# Altium footprint library Module.PcbLib: 36 footprints (part 2 of 3)
Each footprint in its own frame and in the unit in brackets; x right, y up, seen from the top. Pads: shape width x height; smd on the part's side, far side on the other; paste and mask are expansions set on the pad; w line width, h text height; cw(c..) or ccw(c..) is an arc to the next point about the centre after c.
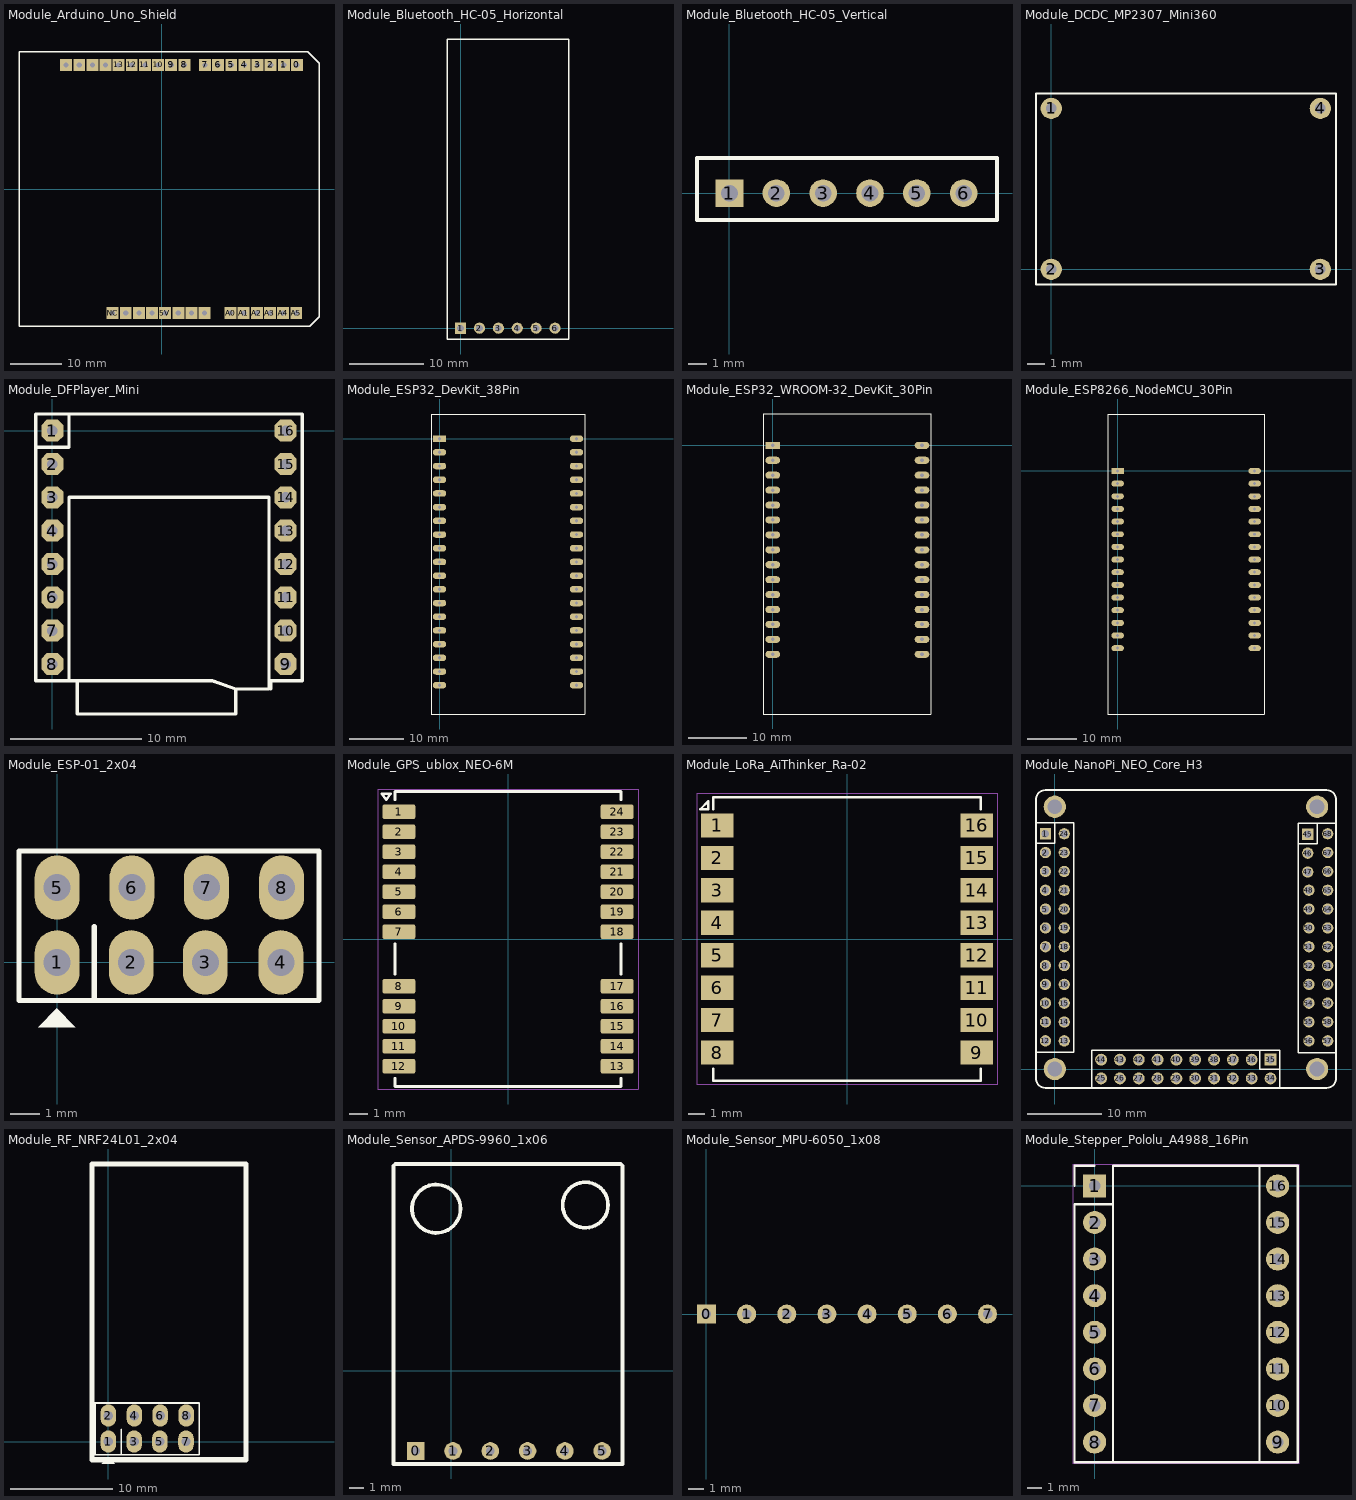
[diagram p1: the footprints below, top view; thin cyan lines are the x and y axes]

## Module_Arduino_Uno_Shield [mm] "Arduino Uno shield header footprint, 32 pins"
pads (32):
  rect 2.3x2.3 hole 1: 0(26.1,24) 1(23.56,24) 2(21.02,24) 3(18.48,24) 3V3(-1.92,-24) 4(15.94,24) 5(13.4,24) 5V(0.62,-24) 6(10.86,24) 7(8.32,24) 8(4.32,24) 9(1.78,24) 10(-0.76,24) 11(-3.3,24) 12(-5.84,24) 13(-8.38,24) A0(13.26,-24) A1(15.8,-24) A2(18.34,-24) A3(20.88,-24) A4(23.42,-24) A5(25.96,-24) AREF(-13.46,24) GND1(3.16,-24) GND2(5.7,-24) GND3(-10.92,24) IOREF(-7,-24) NC(-9.54,-24) RESET(-4.46,-24) SCL(-18.54,24) SDA(-16,24) Vin(8.24,-24)
Top Overlay:
  lines w0.254: -27.64,-26.5 28.56,-26.5 30.36,-24.7 30.36,-6.9 30.36,24.3 28.16,26.5 -27.64,26.5 -27.64,-26.5
3D body "Module_Arduino_Uno_Shield.step": height 3.6, standoff -2.5, extent -27.64,-26.65 30.36,26.65

## Module_Bluetooth_HC-05_Horizontal [mm] "HC-05 Bluetooth module 6-pin header, horizontal"
height 1.14
pads (6):
  rect 1.5x1.5 hole 0.9: 1(0,0)
  round 1.5 hole 0.9: 2(2.54,0) 3(5.08,0) 4(7.62,0) 5(10.16,0) 6(12.7,0)
Top Overlay:
  lines w0.2: -1.763,-1.455 14.511,-1.455 14.511,38.862 -1.763,38.862 -1.763,-1.455
3D body "User Library-blue.STEP": height 4.05, standoff -0.75, extent -1.522,-0.635 14.478,38.784

## Module_Bluetooth_HC-05_Vertical [mm] "HC-05 Bluetooth module 6-pin header, vertical"
height 1.14
pads (6):
  rect 1.5x1.5 hole 0.9: 1(0,0)
  round 1.5 hole 0.9: 2(2.54,0) 3(5.08,0) 4(7.62,0) 5(10.16,0) 6(12.7,0)
Top Overlay:
  lines w0.2: -1.763,-1.455 14.511,-1.455 14.511,1.905 -1.763,1.905 -1.763,-1.455
3D body "female_header_a-bl254-eg-g06d.stp": height 7.92, standoff -3.78, extent -1.395,-1.237 14.095,1.263
3D body "User Library-blue.STEP": height 38, standoff -1.42, extent -1.649,-3.556 14.351,1.239

## Module_DCDC_MP2307_Mini360 [mm] "MP2307 / Mini-360 buck converter module, 4 pins"
pads (4):
  round 1.2 hole 0.6: 1(0,9.114) 2(0,0) 3(15.24,0) 4(15.24,9.114)
Top Overlay:
  lines w0.127: -0.864,-0.864 -0.864,9.957 16.129,9.957 16.129,-0.864 -0.864,-0.864
3D body "Module_DCDC_MP2307_Mini360.step": height 6.6, standoff -2.5, extent -2.087,-2.11 17.353,11.204

## Module_DFPlayer_Mini [mil] "DFPlayer Mini MP3 player module, 16 pins, pitch 2.54mm"
pads (16):
  oct 66x66 / inner oct 60x60 / far side oct 66x66 hole 31.5: 1(0,0) 2(0,-100) 3(0,-200) 4(0,-300) 5(0,-400) 6(0,-500) 7(0,-600) 8(0,-700) 9(700,-700) 10(700,-600) 11(700,-500) 12(700,-400) 13(700,-300) 14(700,-200) 15(700,-100) 16(700,0)
Top Overlay:
  lines w10: -50,-50 50,-50 50,50 ; 50,-750 50,-200 650,-200 650,-775 550,-775 ; 655,-775 655,-765 655,-750 750,-750 750,50 -50,50 -50,-750 75,-750 ; 75,-750 480,-750 550,-775 ; 75,-750 75,-850 550,-850 550,-775
Mechanical 5:
Mechanical 7:
  lines w5: 50,-750 -50,-750 -50,50 750,50 750,-750 650,-750 ; 50,-750 50,-200 650,-200 650,-750 ; 50,-750 75,-750 ; 75,-750 475,-750 550,-775 ; 75,-750 75,-850 550,-850 550,-775 ; 550,-775 650,-775 650,-750
3D body "DFPlayer Mini Assem v1.step": height 418.11, standoff -22.83, extent -59.44,-859.17 759.46,64.45

## Module_ESP32_DevKit_38Pin [mm] "ESP32 DevKit 38-pin board footprint, pitch 2.54mm"
pads (38):
  rect 2.5x1.2 hole 0.6: 1(0,0)
  oval 2.5x1.2 hole 0.6: 2(0,-2.54) 3(0,-5.08) 4(0,-7.62) 5(0,-10.16) 6(0,-12.7) 7(0,-15.24) 8(0,-17.78) 9(0,-20.32) 10(0,-22.86) 11(0,-25.4) 12(0,-27.94) 13(0,-30.48) 14(0,-33.02) 15(0,-35.56) 16(0,-38.1) 17(0,-40.64) 18(0,-43.18) 19(0,-45.72) 20(25.4,-45.72) 21(25.4,-43.18) 22(25.4,-40.64) 23(25.4,-38.1) 24(25.4,-35.56) 25(25.4,-33.02) 26(25.4,-30.48) 27(25.4,-27.94) 28(25.4,-25.4) 29(25.4,-22.86) 30(25.4,-20.32) 31(25.4,-17.78) 32(25.4,-15.24) 33(25.4,-12.7) 34(25.4,-10.16) 35(25.4,-7.62) 36(25.4,-5.08) 37(25.4,-2.54) 38(25.4,0)
Top Overlay:
  lines w0.2: -1.524,-51.054 -1.524,4.572 13.335,4.572 26.924,4.572 26.924,-51.054 -1.524,-51.054
3D body "Goouuu-ESP32 Development Board.STEP": height 9.68, standoff -3.46, extent -1.27,-50.99 26.67,4.59

## Module_ESP32_WROOM-32_DevKit_30Pin [mm] "ESP32-WROOM-32 DevKit 30-pin board footprint, pitch 2.54mm"
pads (30):
  rect 2.5x1.2 hole 0.6: 1(0,0)
  oval 2.5x1.2 hole 0.6: 2(0,-2.54) 3(0,-5.08) 4(0,-7.62) 5(0,-10.16) 6(0,-12.7) 7(0,-15.24) 8(0,-17.78) 9(0,-20.32) 10(0,-22.86) 11(0,-25.4) 12(0,-27.94) 13(0,-30.48) 14(0,-33.02) 15(0,-35.56) 16(25.4,-35.56) 17(25.4,-33.02) 18(25.4,-30.48) 19(25.4,-27.94) 20(25.4,-25.4) 21(25.4,-22.86) 22(25.4,-20.32) 23(25.4,-17.78) 24(25.4,-15.24) 25(25.4,-12.7) 26(25.4,-10.16) 27(25.4,-7.62) 28(25.4,-5.08) 29(25.4,-2.54) 30(25.4,0)
Top Overlay:
  lines w0.2: -1.651,-45.72 -1.651,5.334 13.335,5.334 26.924,5.334 26.924,-45.72 -1.651,-45.72
3D body "ESP-WROOM32.STEP": height 10.49, standoff -1.91, extent -1.651,-45.596 26.849,5.334

## Module_ESP8266_NodeMCU_30Pin [mm] "NodeMCU ESP8266 30-pin development board footprint"
pads (30):
  rect 2.5x1.2 hole 0.6: 1(0,0)
  oval 2.5x1.2 hole 0.6: 2(0,-2.54) 3(0,-5.08) 4(0,-7.62) 5(0,-10.16) 6(0,-12.7) 7(0,-15.24) 8(0,-17.78) 9(0,-20.32) 10(0,-22.86) 11(0,-25.4) 12(0,-27.94) 13(0,-30.48) 14(0,-33.02) 15(0,-35.56) 16(27.5,-35.56) 17(27.5,-33.02) 18(27.5,-30.48) 19(27.5,-27.94) 20(27.5,-25.4) 21(27.5,-22.86) 22(27.5,-20.32) 23(27.5,-17.78) 24(27.5,-15.24) 25(27.5,-12.7) 26(27.5,-10.16) 27(27.5,-7.62) 28(27.5,-5.08) 29(27.5,-2.54) 30(27.5,0)
Top Overlay:
  lines w0.2: -2.032,-48.768 -2.032,11.43 14.385,11.43 29.464,11.43 29.464,-48.768 -2.032,-48.768
3D body "ESP8266.STEP": height 9.03, standoff -1.11, extent -2.036,-48.677 29.464,11.303

## Module_ESP-01_2x04 [mil] "ESP-01 ESP8266 Wi-Fi module header 2x4, pitch 2.54mm"
pads (8):
  oval 60x86 hole 36: 1(0,0) 2(99,0) 3(198,0) 4(299,0) 5(0,100) 6(100,100) 7(199.5,100) 8(300,100)
Top Overlay:
  region: -0.5,-61.5 -25.5,-86.5 24.5,-86.5
  lines w7: 49.5,-50.5 49.5,47.5 ; -51,-51 350,-51 350,149 -51,149 -51,49 -51,-51
3D body "User Library-Wi07C.STEP": height 381.4, standoff -78.35, extent -137.44,-817.38 433.43,159

## Module_GPS_ublox_NEO-6M [mm] "u-blox NEO-6M / NEO-7M / NEO-M8N SMD GNSS GPS receiver module (24 pins, 12.2x16.0mm)"
height 3
pads (24):
  rrect25% 1.8x0.8 smd: 1(-6,7) 2(-6,5.9) 3(-6,4.8) 4(-6,3.7) 5(-6,2.6) 6(-6,1.5) 7(-6,0.4) 8(-6,-2.6) 9(-6,-3.7) 10(-6,-4.8) 11(-6,-5.9) 12(-6,-7) 13(6,-7) 14(6,-5.9) 15(6,-4.8) 16(6,-3.7) 17(6,-2.6) 18(6,0.4) 19(6,1.5) 20(6,2.6) 21(6,3.7) 22(6,4.8) 23(6,5.9) 24(6,7)
Top Overlay:
  lines w0.15: -6.21,-7.66 -6.21,-8.11 6.21,-8.11 ; -6.21,-1.94 -6.21,-0.26 ; -6.21,7.66 -6.21,8.11 6.21,8.11 6.21,7.66 ; 6.21,-8.1 6.21,-7.66 ; 6.21,-1.94 6.21,-0.26 ; -6.94,7.99 -6.7,7.66 -6.46,7.99 -6.94,7.99
Mechanical 4:
  lines w0.05: -7.15,-8.25 -7.15,8.25 7.15,8.25 7.15,-8.25 -7.15,-8.25
3D body "GPS_NEO6M.step": height 3, standoff 0, extent -6.1,-8 6.1,8

## Module_LoRa_AiThinker_Ra-02 [mm] "Ai-Thinker Ra-01 / Ra-02 SX1278 433MHz LoRa spread-spectrum transceiver module (16 pins)"
height 3
pads (16):
  rect 2x1.5 smd: 1(-8,7) 2(-8,5) 3(-8,3) 4(-8,1) 5(-8,-1) 6(-8,-3) 7(-8,-5) 8(-8,-7) 9(8,-7) 10(8,-5) 11(8,-3) 12(8,-1) 13(8,1) 14(8,3) 15(8,5) 16(8,7)
Top Overlay:
  lines w0.15: -8.25,-8 -8.25,-8.75 8.25,-8.75 8.25,-8 ; -8.25,8 -8.25,8.75 8.25,8.75 8.25,8 ; -9.05,8 -8.55,8 -8.55,8.5 -9.05,8
Mechanical 4:
  lines w0.05: -9.25,-9 -9.25,9 9.25,9 9.25,-9 -9.25,-9
3D body "LoRa_Ra02.step": height 3, standoff 0, extent -1,-16.5 16,0

## Module_NanoPi_NEO_Core_H3 [mm] "NanoPi NEO Core H3 board footprint, 72 pins"
pads (72):
  rect 1.52x1.52 hole 1.02: 1(-1.27,31.75) 45(34.138,31.674)
  round 1.52 hole 1.02: 2(-1.27,29.21) 3(-1.27,26.67) 4(-1.27,24.13) 5(-1.27,21.59) 6(-1.27,19.05) 7(-1.27,16.51) 8(-1.27,13.97) 9(-1.27,11.43) 10(-1.27,8.89) 11(-1.27,6.35) 12(-1.27,3.81) 13(1.27,3.81) 14(1.27,6.35) 15(1.27,8.89) 16(1.27,11.43) 17(1.27,13.97) 18(1.27,16.51) 19(1.27,19.05) 20(1.27,21.59) 21(1.27,24.13) 22(1.27,26.67) 23(1.27,29.21) 24(1.27,31.75) 46(34.138,29.134) 47(34.138,26.594) 48(34.29,24.13) 49(34.29,21.59) 50(34.29,19.05) 51(34.29,16.51) 52(34.29,13.97) 53(34.29,11.43) 54(34.29,8.89) 55(34.29,6.35) 56(34.29,3.81) 57(36.83,3.81) 58(36.83,6.35) 59(36.83,8.89) 60(36.83,11.43) 61(36.83,13.97) 62(36.83,16.51) 63(36.83,19.05) 64(36.83,21.59) 65(36.83,24.13) 66(36.83,26.67) 67(36.83,29.21) 68(36.83,31.75)
  round 1.6 hole 1.1: 25(6.248,-1.27) 26(8.788,-1.27) 27(11.328,-1.27) 28(13.868,-1.27) 29(16.408,-1.27) 30(18.948,-1.27) 31(21.488,-1.27) 32(24.028,-1.27) 33(26.568,-1.27) 34(29.108,-1.27) 36(26.568,1.27) 37(24.028,1.27) 38(21.488,1.27) 39(18.948,1.27) 40(16.408,1.27) 41(13.868,1.27) 42(11.328,1.27) 43(8.788,1.27) 44(6.248,1.27)
  rect 1.6x1.6 hole 1.1: 35(29.108,1.27)
  round 3 hole 2: ""(0,0) ""(0,35.4) ""(35.4,0) ""(35.4,35.4)
Top Overlay:
  lines w0.2: -2.54,30.484 0,30.484 0,33.274 ; 27.686,2.54 27.686,0 30.226,0 ; 33.02,30.404 35.408,30.404 35.408,33.194 ; -2.54,2.294 -2.54,33.274 2.54,33.274 2.54,2.294 -2.54,2.294 ; 4.978,-2.54 4.978,2.54 30.378,2.54 30.378,-2.54 4.978,-2.54 ; 32.868,2.214 32.868,33.194 37.948,33.194 37.948,2.214 32.868,2.214
  lines w0.254: -2.54,-1.27 ccw(c-1.27,-1.27) -1.27,-2.54 36.678,-2.54 ccw(c36.678,-1.27) 37.948,-1.27 37.948,36.373 ccw(c36.678,36.373) 36.678,37.643 -1.27,37.643 ccw(c-1.27,36.373) -2.54,36.373 -2.54,2.294 -2.54,-1.27
3D body "61302421821.stp": height 8.51, standoff -3.09, extent 32.867,2.214 37.947,33.194
3D body "61302421821.stp": height 8.51, standoff -3.09, extent -2.54,2.294 2.54,33.274
3D body "61302021121.stp": height 8.55, standoff -2.99, extent 4.978,-2.54 30.378,2.54

## Module_RF_NRF24L01_2x04 [mil] "nRF24L01 2.4GHz RF transceiver module header 2x4, pitch 2.54mm"
pads (8):
  oval 60x86 hole 36: 1(0,0) 2(0,100) 3(99,0) 4(100,100) 5(198,0) 6(199.5,100) 7(299,0) 8(300,100)
Top Overlay:
  region: -0.5,-61.5 -25.5,-86.5 24.5,-86.5
  lines w7: 49.5,-50.5 49.5,47.5 ; -51,-51 350,-51 350,149 -51,149 -51,49 -51,-51
  lines w20: -63,-70 530,-70 530,1069.2 -63,1069.2 -63,-70
3D body "User Library-MY-NRF24L01P.STEP": height 587.8, standoff 0.73, extent -73,-73.7 517.55,1068.03

## Module_Sensor_APDS-9960_1x06 [mm] "APDS-9960 gesture/RGB sensor module, 6-pin header"
pads (6):
  rect 1.2x1.2 hole 0.6: 0(-2.413,-5.461)
  round 1.2 hole 0.6: 1(0.127,-5.461) 2(2.667,-5.461) 3(5.207,-5.461) 4(7.747,-5.461) 5(10.287,-5.461)
Top Overlay:
  circle w0.254: c-1.016,11.049 r1.651
  circle w0.254: c9.144,11.303 r1.55
  lines w0.254: -3.937,13.97 -3.937,-6.35 11.684,-6.35 11.684,13.97 11.557,14.097 -3.81,14.097
3D body "?????? ???????? ??????, ?????, ??????????? APDS-9960.SLDPRT": height 9.47, standoff -1.88, extent -3.813,-6.35 11.687,14.089

## Module_Sensor_MPU-6050_1x08 [mm] "MPU-6050 IMU sensor module, 8-pin header"
pads (8):
  rect 1.2x1.2 hole 0.6: 0(0,0)
  round 1.2 hole 0.6: 1(2.54,0) 2(5.08,0) 3(7.62,0) 4(10.16,0) 5(12.7,0) 6(15.24,0) 7(17.78,0)
3D body "ITG-MPU.STEP": height 11.03, standoff -0.72, extent -1.987,-1.524 19.513,14.976

## Module_Stepper_Pololu_A4988_16Pin [mm] "16-pin Pololu StepStick stepper motor driver socket (A4988 / DRV8825 / TMC2208)"
height 15.1
pads (16):
  rect 1.6x1.6 hole 0.8: 1(0,0)
  round 1.6 hole 0.8: 2(0,-2.54) 3(0,-5.08) 4(0,-7.62) 5(0,-10.16) 6(0,-12.7) 7(0,-15.24) 8(0,-17.78) 9(12.7,-17.78) 10(12.7,-15.24) 11(12.7,-12.7) 12(12.7,-10.16) 13(12.7,-7.62) 14(12.7,-5.08) 15(12.7,-2.54) 16(12.7,0)
Top Overlay:
  lines w0.15: -1.4,0 -1.4,1.4 0,1.4 ; 1.27,-19.18 1.27,-1.27 ; 11.43,-19.18 11.43,1.4 ; 1.27,-1.27 1.27,1.4 14.1,1.4 14.1,-19.18 -1.4,-19.18 -1.4,-1.27 1.27,-1.27
Mechanical 4:
  lines w0.05: -1.53,-19.3 -1.53,1.52 14.21,1.52 14.21,-19.3 -1.53,-19.3
3D body "Module_Pololu_A4988.step": height 15.1, standoff -3, extent -1.27,-19.05 13.97,1.27